# Altium footprint library SPEC-A7.PcbLib: 90 footprints (part 6 of 6)
Each footprint in its own frame and in the unit in brackets; x right, y up, seen from the top. Pads: shape width x height; smd on the part's side, far side on the other; paste and mask are expansions set on the pad; w line width, h text height; cw(c..) or ccw(c..) is an arc to the next point about the centre after c.
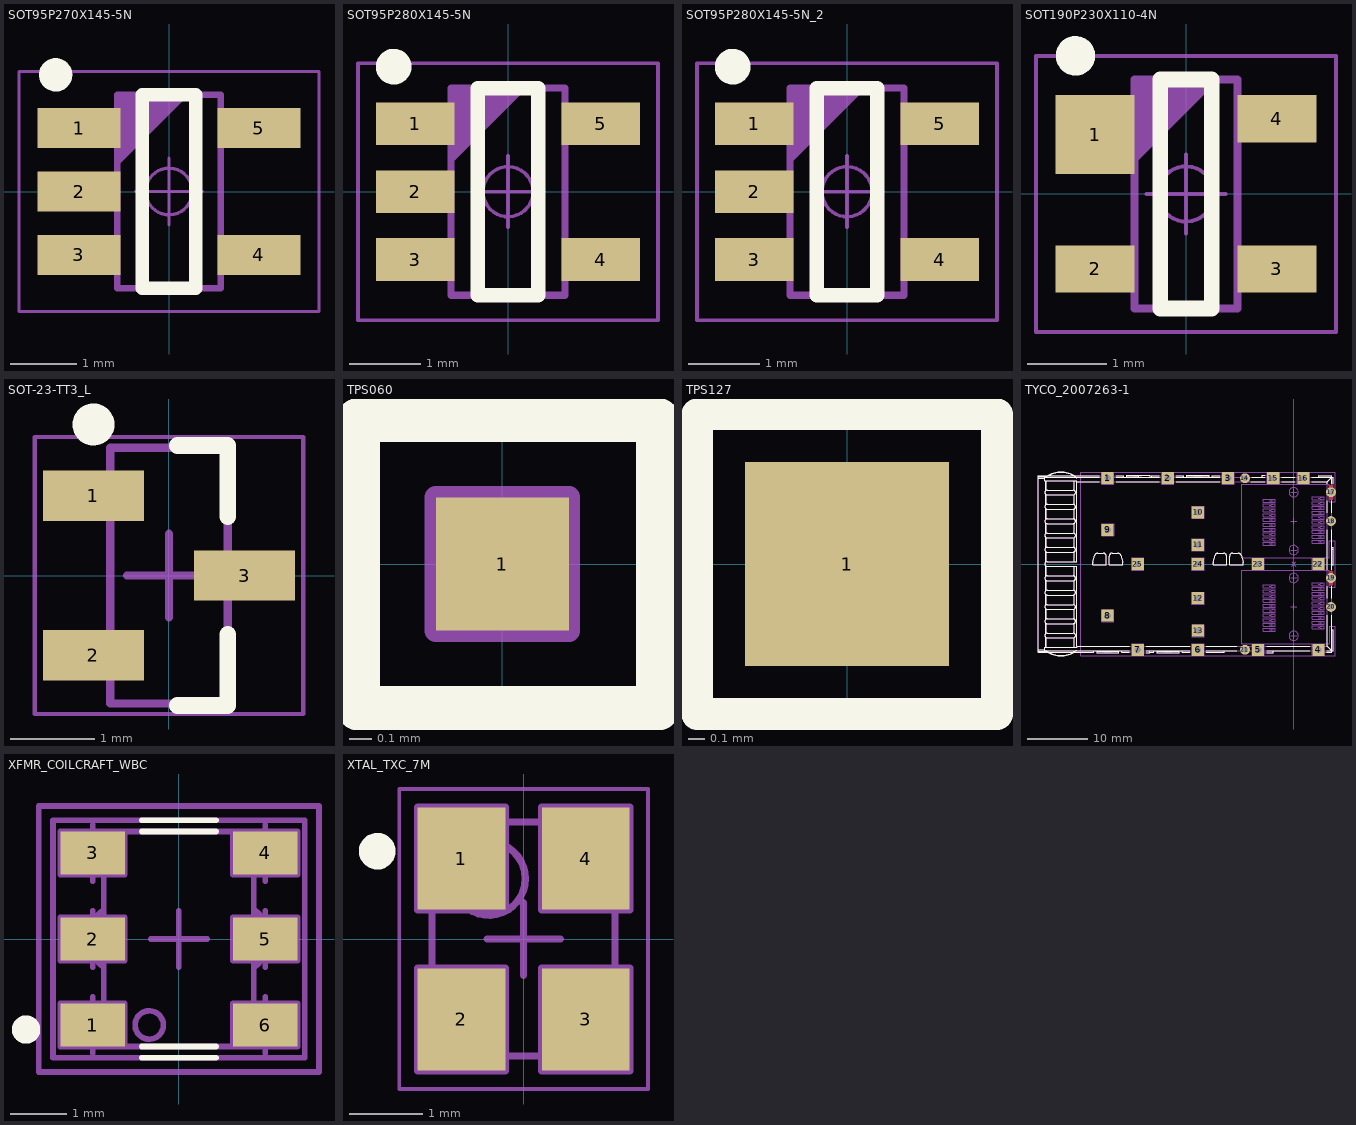
[diagram p5: the footprints below, top view; thin cyan lines are the x and y axes]

## SOT95P270X145-5N [mm]
pads (5):
  rect 1.25x0.6 smd: 1(-1.35,0.95) 2(-1.35,0) 3(-1.35,-0.95) 4(1.35,-0.95) 5(1.35,0.95)
Top Overlay:
  circle w0.25: c-1.7,1.75 r0.125
  lines w0.2: -0.4,-1.45 -0.4,1.45 0.4,1.45 0.4,-1.45 -0.4,-1.45
Mechanical 14:
  lines w0.1: -0.775,0.45 0.225,1.45 ; -0.775,0.55 0.125,1.45 ; -0.775,0.65 0.025,1.45 ; -0.775,0.75 -0.075,1.45 ; -0.775,0.85 -0.175,1.45 ; -0.775,0.95 -0.275,1.45 ; -0.775,1.05 -0.375,1.45 ; -0.775,1.15 -0.475,1.45 ; -0.775,1.25 -0.575,1.45 ; -0.775,1.35 -0.675,1.45 ; -0.775,-1.45 -0.775,1.45 0.775,1.45 0.775,-1.45 -0.775,-1.45
Mechanical 15:
  circle w0.05: c0,0 r0.35
  lines w0.05: -0.5,0 0.5,0 ; 0,-0.5 0,0.5 ; -2.25,-1.8 -2.25,1.8 2.25,1.8 2.25,-1.8 -2.25,-1.8
3D body "SOT95P270X145-5N.stp": height 1.45, standoff 0.01, extent -1.351,-1.45 1.351,1.45

## SOT95P280X145-5N [mm]
pads (5):
  rect 1.1x0.6 smd: 1(-1.3,0.95) 2(-1.3,0) 3(-1.3,-0.95) 4(1.3,-0.95) 5(1.3,0.95)
Top Overlay:
  circle w0.25: c-1.6,1.75 r0.125
  lines w0.2: -0.425,-1.45 -0.425,1.45 0.425,1.45 0.425,-1.45 -0.425,-1.45
Mechanical 14:
  lines w0.1: -0.8,0.45 0.2,1.45 ; -0.8,0.55 0.1,1.45 ; -0.8,0.65 0,1.45 ; -0.8,0.75 -0.1,1.45 ; -0.8,0.85 -0.2,1.45 ; -0.8,0.95 -0.3,1.45 ; -0.8,1.05 -0.4,1.45 ; -0.8,1.15 -0.5,1.45 ; -0.8,1.25 -0.6,1.45 ; -0.8,1.35 -0.7,1.45 ; -0.8,-1.45 -0.8,1.45 0.8,1.45 0.8,-1.45 -0.8,-1.45
Mechanical 15:
  circle w0.05: c0,0 r0.35
  lines w0.05: -0.5,0 0.5,0 ; 0,-0.5 0,0.5 ; -2.1,-1.8 -2.1,1.8 2.1,1.8 2.1,-1.8 -2.1,-1.8
3D body "SOT95P280X145-5N.stp": height 1.45, standoff 0, extent -1.4,-1.5 1.4,1.5

## SOT95P280X145-5N_2 [mm]
pads (5):
  rect 1.1x0.6 smd: 1(-1.3,0.95) 2(-1.3,0) 3(-1.3,-0.95) 4(1.3,-0.95) 5(1.3,0.95)
Top Overlay:
  circle w0.25: c-1.6,1.75 r0.125
  lines w0.2: -0.425,-1.45 0.425,-1.45 0.425,1.45 -0.425,1.45 -0.425,-1.45
Mechanical 14:
  lines w0.1: -0.8,0.45 0.2,1.45 ; -0.8,0.55 0.1,1.45 ; -0.8,0.65 0,1.45 ; -0.8,0.75 -0.1,1.45 ; -0.8,0.85 -0.2,1.45 ; -0.8,0.95 -0.3,1.45 ; -0.8,1.05 -0.4,1.45 ; -0.8,1.15 -0.5,1.45 ; -0.8,1.25 -0.6,1.45 ; -0.8,1.35 -0.7,1.45 ; -0.8,-1.45 0.8,-1.45 0.8,1.45 -0.8,1.45 -0.8,-1.45
Mechanical 15:
  circle w0.05: c0,0 r0.35
  lines w0.05: -0.5,0 0.5,0 ; 0,-0.5 0,0.5 ; -2.1,-1.8 2.1,-1.8 2.1,1.8 -2.1,1.8 -2.1,-1.8
3D body "SOT95P280X145-5N.stp": height 1.45, standoff 0, extent -1.4,-1.5 1.4,1.5

## SOT190P230X110-4N [mm]
pads (4):
  rect 1x1 smd: 1(-1.15,0.75)
  rect 1x0.6 smd: 2(-1.15,-0.95) 3(1.15,-0.95) 4(1.15,0.95)
Top Overlay:
  circle w0.25: c-1.4,1.75 r0.125
  lines w0.2: -0.325,-1.45 0.325,-1.45 0.325,1.45 -0.325,1.45 -0.325,-1.45
Mechanical 14:
  lines w0.1: -0.65,0.45 0.35,1.45 ; -0.65,0.55 0.25,1.45 ; -0.65,0.65 0.15,1.45 ; -0.65,0.75 0.05,1.45 ; -0.65,0.85 -0.05,1.45 ; -0.65,0.95 -0.15,1.45 ; -0.65,1.05 -0.25,1.45 ; -0.65,1.15 -0.35,1.45 ; -0.65,1.25 -0.45,1.45 ; -0.65,1.35 -0.55,1.45 ; -0.65,-1.45 0.65,-1.45 0.65,1.45 -0.65,1.45 -0.65,-1.45
Mechanical 15:
  circle w0.05: c0,0 r0.35
  lines w0.05: -0.5,0 0.5,0 ; 0,-0.5 0,0.5 ; -1.9,-1.75 1.9,-1.75 1.9,1.75 -1.9,1.75 -1.9,-1.75
3D body "SOT143N.stp": height 1.1, standoff 0, extent -1.25,-1.5 1.25,1.5

## SOT-23-TT3_L [mm]
pads (3):
  rect 1.2x0.6 smd: 1(-0.9,0.95) 2(-0.9,-0.95) 3(0.9,0)
Top Overlay:
  circle w0.25: c-0.9,1.8 r0.125
  lines w0.2: 0.1,-1.55 0.7,-1.55 0.7,-0.7 ; 0.1,1.55 0.7,1.55 0.7,0.7
Mechanical 13:
  lines w0.1: -0.7,-1.525 0.7,-1.525 0.7,1.525 -0.7,1.525 -0.7,-1.525
Mechanical 15:
  lines w0.05: -1.6,-1.65 1.6,-1.65 1.6,1.65 -1.6,1.65 -1.6,-1.65
  lines w0.1: -0.5,0 0.5,0 ; 0,-0.5 0,0.5
3D body: height 1.12, standoff 0.01, extent -0.7,-1.525 0.7,1.525

## TPS060 [mm]
pads (1):
  rect 0.6x0.6 smd paste-1.27: 1(0,0)
Top Overlay:
  lines w0.2: -0.65,-0.65 0.7,-0.65 0.7,0.65 -0.65,0.65 -0.65,-0.65
Mechanical 14:
  lines w0.1: -0.3,-0.3 -0.3,0.3 0.3,0.3 0.3,-0.3 -0.3,-0.3

## TPS127 [mm]
pads (1):
  rect 1.27x1.27 smd paste-1.27: 1(0,0)
Top Overlay:
  lines w0.2: -0.935,-0.935 -0.935,0.935 0.935,0.935 0.935,-0.935 -0.935,-0.935
Mechanical 14:
  lines w0.1: -0.585,-0.585 -0.585,0.585 0.585,0.585 0.585,-0.585 -0.585,-0.585

## TYCO_2007263-1 [mm]
pads (25):
  rect 2x2 hole 1.05: 1(-30.9,14.25) 2(-20.9,14.25) 3(-10.9,14.25) 4(4.1,-14.25) 5(-5.9,-14.25) 6(-15.9,-14.25) 7(-25.9,-14.25) 8(-30.9,-8.575) 9(-30.9,5.675) 10(-15.9,8.575) 11(-15.9,3.175) 12(-15.9,-5.675) 13(-15.9,-11.075)
  round 1.65 hole 0.95: 14(-8.1,14.25) 17(6.2,11.925) 18(6.2,7.125) 19(6.2,-2.325) 20(6.2,-7.125) 21(-8.1,-14.25)
  rect 2x2 hole 0.95: 15(-3.4,14.25) 16(1.6,14.25) 22(4.1,0) 23(-5.9,0) 24(-15.9,0) 25(-25.9,0)
Top Layer:
  region: 5.9,13.07 6.5,13.07 6.5,10.77 5.9,10.77
  region: 5.9,-1.18 6.5,-1.18 6.5,-3.48 5.9,-3.48
Top Overlay:
  drawing of 250 lines, arcs and shapes, not listed
Mechanical 8:
  drawing of 491 lines, arcs and shapes, not listed
  text "1" at -2.8,10.775 h1
  text "10" at -2.8,3.925 h1
  text "11" at 1.8,4.225 h1
  text "20" at 1.8,11.613 h1
  text "1" at -2.8,-3.475 h1
  text "10" at -2.8,-10.325 h1
  text "11" at 1.8,-10.025 h1
  text "20" at 1.8,-2.637 h1
  text "Component and Trace Keep-Out / Except Cage Chassis Ground" at -31.6,-13.5 h1
Mechanical 14:
  drawing of 238 lines, arcs and shapes, not listed
Drill Drawing:
  lines w0.1: -29.5,-3.4 -9.3,-3.4 -5.9,0 ; -29.4,-9.4 -10.75,-9.4 -5.9,-14.25 ; -31.9,-15.25 6.9,-15.25 6.9,15.25 -31.9,15.25 -31.9,-15.25
  text "PRESS-FIT" at -26.4,-5.1 h1
  text "13x diam. 1.05mm +/-0.05" at -29.2,-8.7 h1
  text "12x diam. 0.95mm +/-0.05" at -29.4,-2.8 h1
  text "TECHNOLOGY" at -27.2,-7 h1
3D body "TYCO_2007263-1.stp": height 10.6, standoff -2.05, extent -42.4,-15.273 6.575,15.273

## XFMR_COILCRAFT_WBC [mm]
pads (6):
  rect 1.14x0.76 smd: 1(-1.525,-1.52) 2(-1.525,0) 3(-1.525,1.52) 4(1.525,1.52) 5(1.525,0) 6(1.525,-1.52)
Top Overlay:
  circle w0.25: c-2.7,-1.6 r0.125
  lines w0.1: -0.655,-2.1 0.655,-2.1 ; -0.655,-1.9 0.655,-1.9 ; -0.655,1.9 0.655,1.9 ; -0.655,2.1 0.655,2.1
Mechanical 8:
  lines w0.1: -2.025,-1.52 -1.525,-1.52 ; -2.025,0 -1.525,0 ; -2.025,1.52 -1.525,1.52 ; -1.525,-2.02 -1.525,-1.52 ; -1.525,-1.02 -1.525,-1.52 ; -1.525,-0.5 -1.525,0 ; -1.525,0.5 -1.525,0 ; -1.525,1.02 -1.525,1.52 ; -1.525,2.02 -1.525,1.52 ; -1.025,-1.52 -1.525,-1.52 ; -1.025,0 -1.525,0 ; -1.025,1.52 -1.525,1.52 ; -0.5,0 0,0 ; 0,-0.5 0,0 ; 0,0.5 0,0 ; 0.5,0 0,0 ; 1.025,-1.52 1.525,-1.52 ; 1.025,0 1.525,0 ; 1.025,1.52 1.525,1.52 ; 1.525,-2.02 1.525,-1.52 ; 1.525,-1.02 1.525,-1.52 ; 1.525,-0.5 1.525,0 ; 1.525,0.5 1.525,0 ; 1.525,1.02 1.525,1.52 ; 1.525,2.02 1.525,1.52 ; 2.025,-1.52 1.525,-1.52 ; 2.025,0 1.525,0 ; 2.025,1.52 1.525,1.52 ; -2.095,-1.9 -0.955,-1.9 -0.955,-1.14 -2.095,-1.14 -2.095,-1.9 ; -2.095,-0.38 -0.955,-0.38 -0.955,0.38 -2.095,0.38 -2.095,-0.38 ; -2.095,1.14 -0.955,1.14 -0.955,1.9 -2.095,1.9 -2.095,1.14 ; 0.955,-1.9 2.095,-1.9 2.095,-1.14 0.955,-1.14 0.955,-1.9 ; 0.955,-0.38 2.095,-0.38 2.095,0.38 0.955,0.38 0.955,-0.38 ; 0.955,1.14 2.095,1.14 2.095,1.9 0.955,1.9 0.955,1.14
Mechanical 14:
  circle w0.1: c-0.525,-1.52 r0.25
  lines w0.1: -1.325,-0.508 cw(c-0.935,0.01) -1.325,0.528 ; 1.325,-0.508 ccw(c0.935,0.01) 1.325,0.528 ; -2.225,-2.1 2.225,-2.1 2.225,2.1 -2.225,2.1 -2.225,-2.1 ; -1.325,-1.9 1.325,-1.9 1.325,1.9 -1.325,1.9 -1.325,-1.9
Mechanical 15:
  lines w0.1: -2.475,-2.35 2.475,-2.35 2.475,2.35 -2.475,2.35 -2.475,-2.35
3D body "XFMR_COILCRAFT_WBC.stp": height 3.01, standoff 0, extent -2.225,-2.1 2.225,2.1

## XTAL_TXC_7M [mm]
pads (4):
  rect 1.2x1.4 smd: 1(-0.85,1.1) 2(-0.85,-1.1) 3(0.85,-1.1) 4(0.85,1.1)
Top Overlay:
  circle w0.25: c-2,1.2 r0.125
Mechanical 8:
  lines w0.1: -1.35,-1.1 -0.85,-1.1 ; -1.35,1.1 -0.85,1.1 ; -0.85,-1.6 -0.85,-1.1 ; -0.85,-0.6 -0.85,-1.1 ; -0.85,0.6 -0.85,1.1 ; -0.85,1.6 -0.85,1.1 ; -0.5,0 0,0 ; -0.35,-1.1 -0.85,-1.1 ; -0.35,1.1 -0.85,1.1 ; 0,-0.5 0,0 ; 0,0.5 0,0 ; 0.35,-1.1 0.85,-1.1 ; 0.35,1.1 0.85,1.1 ; 0.5,0 0,0 ; 0.85,-1.6 0.85,-1.1 ; 0.85,-0.6 0.85,-1.1 ; 0.85,0.6 0.85,1.1 ; 0.85,1.6 0.85,1.1 ; 1.35,-1.1 0.85,-1.1 ; 1.35,1.1 0.85,1.1 ; -1.45,-1.8 -1.45,-0.4 -0.25,-0.4 -0.25,-1.8 -1.45,-1.8 ; -1.45,0.4 -1.45,1.8 -0.25,1.8 -0.25,0.4 -1.45,0.4 ; 0.25,-1.8 0.25,-0.4 1.45,-0.4 1.45,-1.8 0.25,-1.8 ; 0.25,0.4 0.25,1.8 1.45,1.8 1.45,0.4 0.25,0.4
Mechanical 14:
  circle w0.1: c-0.475,0.825 r0.5
  lines w0.1: -1.25,-1.5 cw(c-1.25,-1.6) -1.15,-1.6 1.15,-1.6 cw(c1.25,-1.6) 1.25,-1.5 1.25,1.5 cw(c1.25,1.6) 1.15,1.6 -1.15,1.6 cw(c-1.25,1.6) -1.25,1.5 -1.25,-1.5
Mechanical 15:
  lines w0.05: -1.7,-2.05 -1.7,2.05 1.7,2.05 1.7,-2.05 -1.7,-2.05
3D body "XTAL_TXC_7M.stp": height 0.8, standoff 0, extent -1.25,-1.6 1.25,1.6